# Altium footprint library CONN_TBLOCK.PcbLib: 69 footprints (part 2 of 5)
Each footprint in its own frame and in the unit in brackets; x right, y up, seen from the top. Pads: shape width x height; smd on the part's side, far side on the other; paste and mask are expansions set on the pad; w line width, h text height; cw(c..) or ccw(c..) is an arc to the next point about the centre after c.
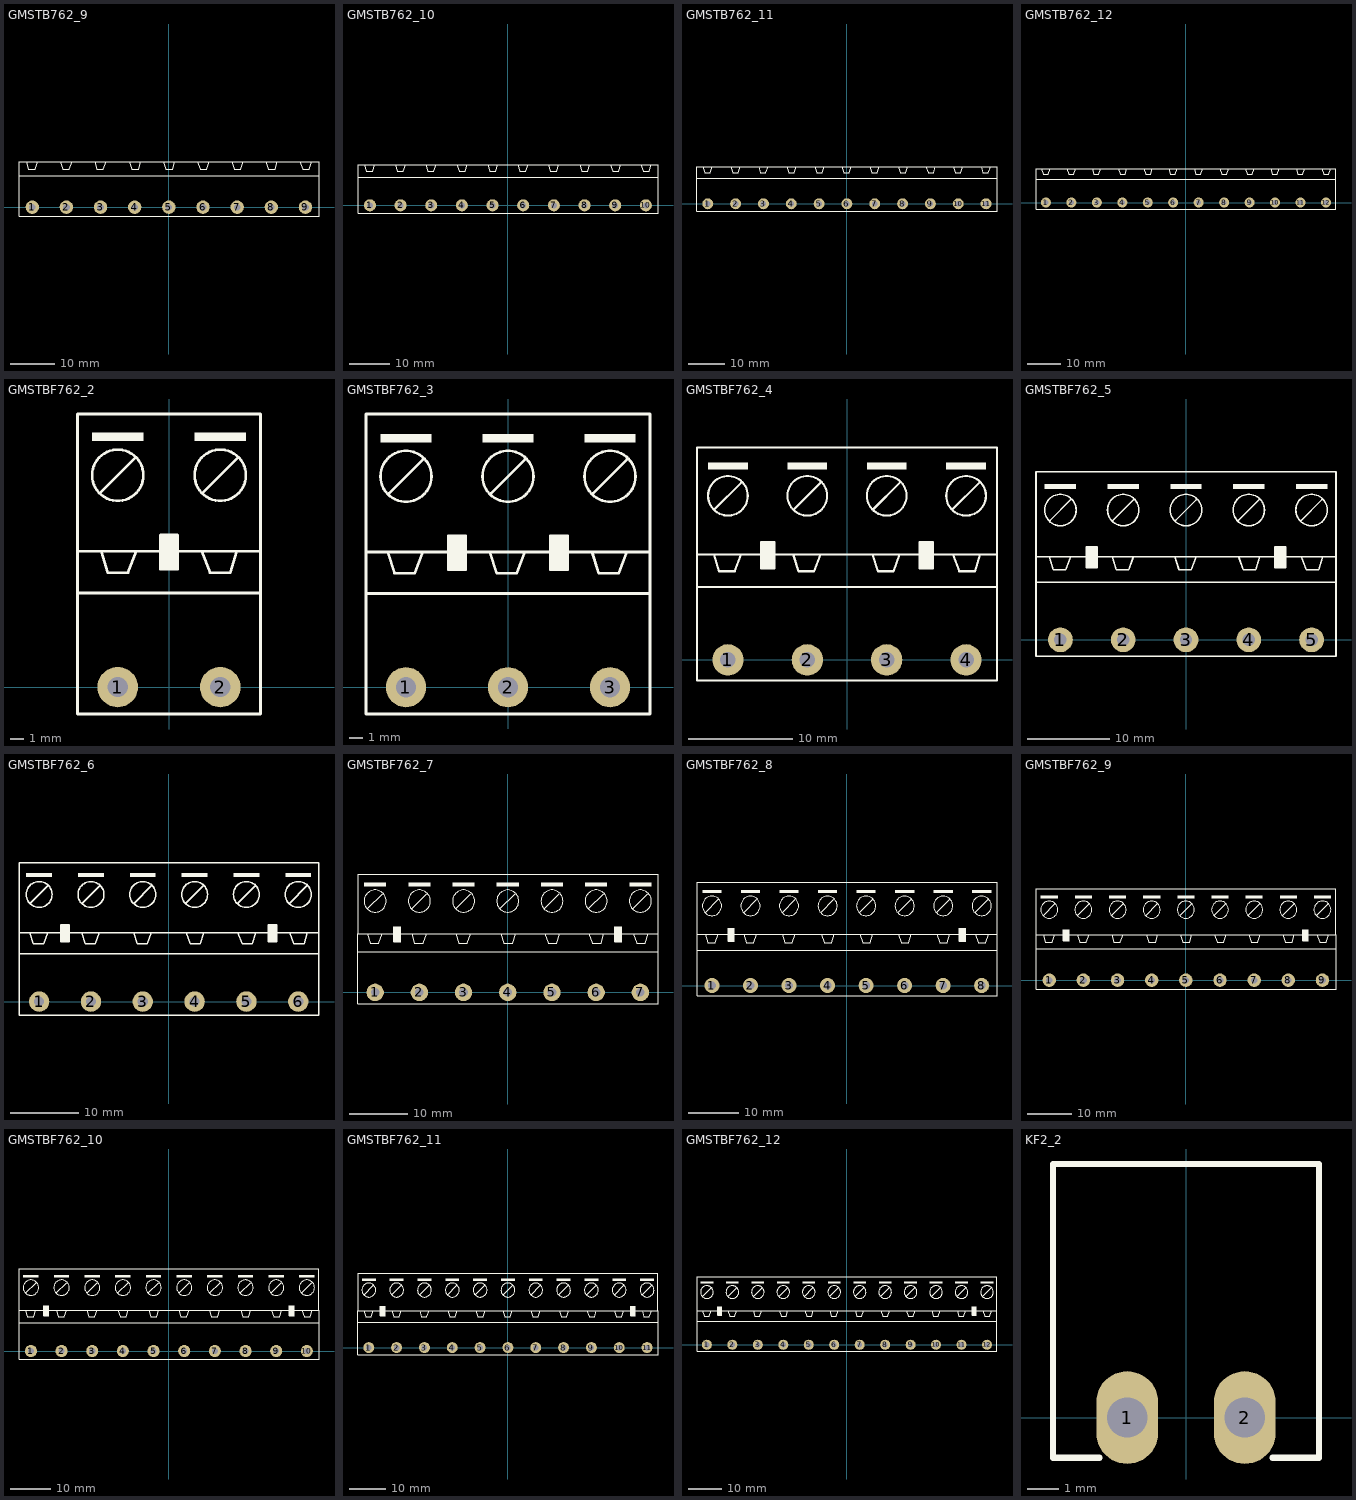
[diagram p1: the footprints below, top view; thin cyan lines are the x and y axes]

## GMSTB762_9 [mm] "PHOENIX, GMSTB 2,5/9-G-7,62, 7.62mm pitch, 9pin"
pads (9):
  round 3 hole 1.5: 1(-30.48,0) 2(-22.86,0) 3(-15.24,0) 4(-7.62,0) 5(0,0) 6(7.62,0) 7(15.24,0) 8(22.86,0) 9(30.48,0)
Top Overlay:
  lines w0.2: -33.44,7 33.5,7 ; -31.83,10.1 -31.33,8.5 -29.83,8.5 -29.23,10.1 ; -24.21,10.1 -23.71,8.5 -22.21,8.5 -21.61,10.1 ; -16.59,10.1 -16.09,8.5 -14.59,8.5 -13.99,10.1 ; -8.87,10.1 -8.27,8.5 -6.77,8.5 -6.27,10.1 ; -1.25,10.1 -0.65,8.5 0.85,8.5 1.35,10.1 ; 6.37,10.1 6.97,8.5 8.47,8.5 8.97,10.1 ; 13.99,10.1 14.59,8.5 16.09,8.5 16.59,10.1 ; 21.61,10.1 22.21,8.5 23.71,8.5 24.21,10.1 ; 29.23,10.1 29.83,8.5 31.33,8.5 31.83,10.1 ; -33.44,-2 33.5,-2 33.5,10.1 -33.44,10.1 -33.44,-2
3D body "GMSTB-2-5-9-G-7-62_3D.stp": height 9.1, standoff -3, extent -33.39,-1.9 33.39,10.102

## GMSTB762_10 [mm] "PHOENIX, GMSTB 2,5/10-G-7,62, 7.62mm pitch, 10pin"
pads (10):
  round 3 hole 1.5: 1(-34.29,0) 2(-26.67,0) 3(-19.05,0) 4(-11.43,0) 5(-3.81,0) 6(3.81,0) 7(11.43,0) 8(19.05,0) 9(26.67,0) 10(34.29,0)
Top Overlay:
  lines w0.2: -37.25,7 37.3,7 ; -35.64,10.1 -35.14,8.5 -33.64,8.5 -33.04,10.1 ; -28.02,10.1 -27.52,8.5 -26.02,8.5 -25.42,10.1 ; -20.4,10.1 -19.9,8.5 -18.4,8.5 -17.8,10.1 ; -12.68,10.1 -12.08,8.5 -10.58,8.5 -10.08,10.1 ; -5.06,10.1 -4.46,8.5 -2.96,8.5 -2.46,10.1 ; 2.46,10.1 2.96,8.5 4.46,8.5 5.06,10.1 ; 10.08,10.1 10.58,8.5 12.08,8.5 12.68,10.1 ; 17.8,10.1 18.4,8.5 19.9,8.5 20.4,10.1 ; 25.42,10.1 26.02,8.5 27.52,8.5 28.02,10.1 ; 33.04,10.1 33.64,8.5 35.14,8.5 35.64,10.1 ; -37.25,-2 37.3,-2 37.3,10.1 -37.25,10.1 -37.25,-2
3D body "GMSTB-2-5-10-G-7-62_3D.stp": height 9.1, standoff -3, extent -37.2,-1.9 37.2,10.102

## GMSTB762_11 [mm] "PHOENIX, GMSTB 2,5/11-G-7,62, 7.62mm pitch, 11pin"
pads (11):
  round 3 hole 1.5: 1(-38.1,0) 2(-30.48,0) 3(-22.86,0) 4(-15.24,0) 5(-7.62,0) 6(0,0) 7(7.62,0) 8(15.24,0) 9(22.86,0) 10(30.48,0) 11(38.1,0)
Top Overlay:
  lines w0.2: -41.06,7 41.1,7 ; -39.45,10.1 -38.95,8.5 -37.45,8.5 -36.85,10.1 ; -31.83,10.1 -31.33,8.5 -29.83,8.5 -29.23,10.1 ; -24.21,10.1 -23.71,8.5 -22.21,8.5 -21.61,10.1 ; -16.49,10.1 -15.89,8.5 -14.39,8.5 -13.89,10.1 ; -8.87,10.1 -8.27,8.5 -6.77,8.5 -6.27,10.1 ; -1.35,10.1 -0.85,8.5 0.65,8.5 1.25,10.1 ; 6.27,10.1 6.77,8.5 8.27,8.5 8.87,10.1 ; 13.99,10.1 14.59,8.5 16.09,8.5 16.59,10.1 ; 21.61,10.1 22.21,8.5 23.71,8.5 24.21,10.1 ; 29.13,10.1 29.63,8.5 31.13,8.5 31.73,10.1 ; 36.75,10.1 37.25,8.5 38.75,8.5 39.35,10.1 ; -41.06,-2 -41.06,10.1 41.1,10.1 41.1,-2 -41.06,-2
3D body "GMSTB-2-5-11-G-7-62_3D.stp": height 9.1, standoff -3, extent -41.01,-1.9 41.01,10.102

## GMSTB762_12 [mm] "PHOENIX, GMSTB 2,5/12-G-7,62, 7.62mm pitch, 12pin"
pads (12):
  round 3 hole 1.5: 1(-41.91,0) 2(-34.29,0) 3(-26.67,0) 4(-19.05,0) 5(-11.43,0) 6(-3.81,0) 7(3.81,0) 8(11.43,0) 9(19.05,0) 10(26.67,0) 11(34.29,0) 12(41.91,0)
Top Overlay:
  lines w0.2: -44.87,7 44.9,7 ; -43.26,10.1 -42.76,8.5 -41.26,8.5 -40.66,10.1 ; -35.64,10.1 -35.14,8.5 -33.64,8.5 -33.04,10.1 ; -28.02,10.1 -27.52,8.5 -26.02,8.5 -25.42,10.1 ; -20.3,10.1 -19.7,8.5 -18.2,8.5 -17.7,10.1 ; -12.68,10.1 -12.08,8.5 -10.58,8.5 -10.08,10.1 ; -5.16,10.1 -4.66,8.5 -3.16,8.5 -2.56,10.1 ; 2.46,10.1 2.96,8.5 4.46,8.5 5.06,10.1 ; 10.18,10.1 10.78,8.5 12.28,8.5 12.78,10.1 ; 17.8,10.1 18.4,8.5 19.9,8.5 20.4,10.1 ; 25.32,10.1 25.82,8.5 27.32,8.5 27.92,10.1 ; 32.94,10.1 33.44,8.5 34.94,8.5 35.54,10.1 ; 40.66,10.1 41.26,8.5 42.76,8.5 43.26,10.1 ; -44.87,-2 44.9,-2 44.9,10.1 -44.87,10.1 -44.87,-2
3D body "GMSTB-2-5-12-G-7-62_3D.stp": height 9.1, standoff -3, extent -44.82,-1.9 44.82,10.102

## GMSTBF762_2 [mm] "PHOENIX, GMSTB 2,5/2-G-7,62, 7.62mm pitch, 2pin"
pads (2):
  round 3 hole 1.5: 1(-3.81,0) 2(3.81,0)
Top Overlay:
  circle w0.2: c3.81,15.748 r1.905
  circle w0.2: c-3.81,15.748 r1.905
  region: 0.635,11.303 -0.635,11.303 -0.635,8.763 0.635,8.763
  region: 5.715,18.923 1.905,18.923 1.905,18.288 5.715,18.288
  region: -1.905,18.923 -5.715,18.923 -5.715,18.288 -1.905,18.288
  lines w0.2: -6.8,7 6.8,7 ; -5.08,14.478 -2.54,17.018 ; -5.05,10.1 -4.55,8.5 -3.05,8.5 -2.45,10.1 ; 2.45,10.1 3.05,8.5 4.55,8.5 5.05,10.1 ; 2.54,14.478 5.08,17.018 ; -6.8,10.1 -6.8,20.3 6.8,20.3 6.8,10.1 ; -6.8,10.1 -6.8,-2 6.8,-2 6.8,10.1 ; -6.8,10.1 6.8,10.1 ; -0.635,8.763 -0.635,11.303 0.635,11.303 0.635,8.763 -0.635,8.763
3D body "GMSTB-2-5-2-G-7-62_3D.stp": height 9.1, standoff -3, extent -6.72,-1.9 6.72,10.102
3D body "GMSTB-2-5-2-ST-7-62_3D.stp": height 15.5, standoff 0.5, extent -6.62,2 6.62,20.2

## GMSTBF762_3 [mm] "PHOENIX, GMSTB 2,5/3-G-7,62, 7.62mm pitch, 3pin"
pads (3):
  round 3 hole 1.5: 1(-7.62,0) 2(0,0) 3(7.62,0)
Top Overlay:
  circle w0.2: c-7.62,15.748 r1.905
  circle w0.2: c0,15.748 r1.905
  circle w0.2: c7.62,15.748 r1.905
  rectangle: 3.175,8.763 4.445,11.303
  region: -3.175,11.303 -4.445,11.303 -4.445,8.763 -3.175,8.763
  region: -5.715,18.923 -9.525,18.923 -9.525,18.288 -5.715,18.288
  region: 1.905,18.923 -1.905,18.923 -1.905,18.288 1.905,18.288
  region: 9.525,18.923 5.715,18.923 5.715,18.288 9.525,18.288
  lines w0.2: -10.6,7 10.6,7 ; -8.97,10.1 -8.47,8.5 -6.97,8.5 -6.37,10.1 ; -8.89,14.478 -6.35,17.018 ; -1.35,10.1 -0.85,8.5 0.65,8.5 1.25,10.1 ; -1.27,14.478 1.27,17.018 ; 6.27,10.1 6.77,8.5 8.27,8.5 8.87,10.1 ; 6.35,14.478 8.89,17.018 ; -10.6,10.1 -10.6,20.4 10.6,20.4 10.6,10.1 ; -10.6,10.1 -10.6,-2 10.6,-2 10.6,10.1 ; -10.6,10.1 10.6,10.1 ; -4.445,8.763 -4.445,11.303 -3.175,11.303 -3.175,8.763 -4.445,8.763 ; 3.175,8.763 4.445,8.763 4.445,11.303 3.175,11.303 3.175,8.763
3D body "GMSTB-2-5-3-ST-7-62_3D.stp": height 15.5, standoff 0.5, extent -10.43,2 10.43,20.2
3D body "GMSTB-2-5-3-G-7-62_3D.stp": height 9.1, standoff -3, extent -10.53,-1.9 10.53,10.102

## GMSTBF762_4 [mm] "PHOENIX, GMSTB 2,5/4-G-7,62, 7.62mm pitch, 4pin"
pads (4):
  round 3 hole 1.5: 1(-11.43,0) 2(-3.81,0) 3(3.81,0) 4(11.43,0)
Top Overlay:
  circle w0.2: c11.43,15.748 r1.905
  circle w0.2: c3.81,15.748 r1.905
  circle w0.2: c-3.81,15.748 r1.905
  circle w0.2: c-11.43,15.748 r1.905
  region: 13.335,18.923 9.525,18.923 9.525,18.288 13.335,18.288
  region: 5.715,18.923 1.905,18.923 1.905,18.288 5.715,18.288
  region: -1.905,18.923 -5.715,18.923 -5.715,18.288 -1.905,18.288
  region: -9.525,18.923 -13.335,18.923 -13.335,18.288 -9.525,18.288
  region: -6.985,11.303 -8.255,11.303 -8.255,8.763 -6.985,8.763
  rectangle: 6.985,8.763 8.255,11.303
  lines w0.2: -14.4,7 14.4,7 ; -12.78,10.1 -12.28,8.5 -10.78,8.5 -10.18,10.1 ; -12.7,14.478 -10.16,17.018 ; -5.16,10.1 -4.66,8.5 -3.16,8.5 -2.56,10.1 ; -5.08,14.478 -2.54,17.018 ; 2.46,10.1 2.96,8.5 4.46,8.5 5.06,10.1 ; 2.54,14.478 5.08,17.018 ; 10.16,14.478 12.7,17.018 ; 10.18,10.1 10.78,8.5 12.28,8.5 12.78,10.1 ; -14.4,10.1 14.4,10.1 ; -14.4,10.1 -14.4,-2 14.4,-2 14.4,10.1 ; -14.4,10.1 -14.4,20.4 14.4,20.4 14.4,10.1 ; -8.255,8.763 -6.985,8.763 -6.985,11.303 -8.255,11.303 -8.255,8.763 ; 6.985,8.763 6.985,11.303 8.255,11.303 8.255,8.763 6.985,8.763
3D body "GMSTB-2-5-4-ST-7-62_3D.stp": height 15.5, standoff 0.5, extent -14.24,2 14.24,20.2
3D body "GMSTB-2-5-4-G-7-62_3D.stp": height 9.1, standoff -3, extent -14.34,-1.9 14.34,10.102

## GMSTBF762_5 [mm] "PHOENIX, GMSTB 2,5/5-G-7,62, 7.62mm pitch, 5pin"
pads (5):
  round 3 hole 1.5: 1(-15.24,0) 2(-7.62,0) 3(0,0) 4(7.62,0) 5(15.24,0)
Top Overlay:
  circle w0.2: c15.24,15.748 r1.905
  circle w0.2: c7.62,15.748 r1.905
  circle w0.2: c0,15.748 r1.905
  circle w0.2: c-7.62,15.748 r1.905
  circle w0.2: c-15.24,15.748 r1.905
  region: -10.795,11.303 -12.065,11.303 -12.065,8.763 -10.795,8.763
  rectangle: 10.795,8.763 12.065,11.303
  region: 17.145,18.923 13.335,18.923 13.335,18.288 17.145,18.288
  region: 9.525,18.923 5.715,18.923 5.715,18.288 9.525,18.288
  region: 1.905,18.923 -1.905,18.923 -1.905,18.288 1.905,18.288
  region: -5.715,18.923 -9.525,18.923 -9.525,18.288 -5.715,18.288
  region: -13.335,18.923 -17.145,18.923 -17.145,18.288 -13.335,18.288
  lines w0.2: -18.2,7 18.2,7 ; -16.59,10.1 -16.09,8.5 -14.59,8.5 -13.99,10.1 ; -16.51,14.478 -13.97,17.018 ; -8.97,10.1 -8.47,8.5 -6.97,8.5 -6.37,10.1 ; -8.89,14.478 -6.35,17.018 ; -1.35,10.1 -0.85,8.5 0.65,8.5 1.25,10.1 ; -1.27,14.478 1.27,17.018 ; 6.35,14.478 8.89,17.018 ; 6.37,10.1 6.97,8.5 8.47,8.5 8.97,10.1 ; 13.97,14.478 16.51,17.018 ; 13.99,10.1 14.59,8.5 16.09,8.5 16.59,10.1 ; -18.2,10.1 18.2,10.1 ; -18.2,10.1 -18.2,-2 18.2,-2 18.2,10.1 ; -18.2,10.1 -18.2,20.4 18.2,20.4 18.2,10.1 ; -12.065,8.763 -12.065,11.303 -10.795,11.303 -10.795,8.763 -12.065,8.763 ; 10.795,8.763 12.065,8.763 12.065,11.303 10.795,11.303 10.795,8.763
3D body "GMSTB-2-5-5-G-7-62_3D.stp": height 9.1, standoff -3, extent -18.15,-1.9 18.15,10.102
3D body "GMSTB-2-5-5-ST-7-62_3D.stp": height 15.5, standoff 0.5, extent -18.05,2 18.05,20.2

## GMSTBF762_6 [mm] "PHOENIX, GMSTB 2,5/6-G-7,62, 7.62mm pitch, 6pin"
pads (6):
  round 3 hole 1.5: 1(-19.05,0) 2(-11.43,0) 3(-3.81,0) 4(3.81,0) 5(11.43,0) 6(19.05,0)
Top Overlay:
  circle w0.2: c19.05,15.748 r1.905
  circle w0.2: c11.43,15.748 r1.905
  circle w0.2: c3.81,15.748 r1.905
  circle w0.2: c-3.81,15.748 r1.905
  circle w0.2: c-11.43,15.748 r1.905
  circle w0.2: c-19.05,15.748 r1.905
  rectangle: 14.605,8.763 15.875,11.303
  region: -14.605,11.303 -15.875,11.303 -15.875,8.763 -14.605,8.763
  region: 20.955,18.923 17.145,18.923 17.145,18.288 20.955,18.288
  region: 13.335,18.923 9.525,18.923 9.525,18.288 13.335,18.288
  region: 5.715,18.923 1.905,18.923 1.905,18.288 5.715,18.288
  region: -1.905,18.923 -5.715,18.923 -5.715,18.288 -1.905,18.288
  region: -9.525,18.923 -13.335,18.923 -13.335,18.288 -9.525,18.288
  region: -17.145,18.923 -20.955,18.923 -20.955,18.288 -17.145,18.288
  lines w0.2: -22.01,7 22.1,7 ; -22,10.1 -22,20.4 22.1,20.4 22.1,10.1 ; -20.4,10.1 -19.9,8.5 -18.4,8.5 -17.8,10.1 ; -20.32,14.478 -17.78,17.018 ; -12.78,10.1 -12.28,8.5 -10.78,8.5 -10.18,10.1 ; -12.7,14.478 -10.16,17.018 ; -5.16,10.1 -4.66,8.5 -3.16,8.5 -2.56,10.1 ; -5.08,14.478 -2.54,17.018 ; 2.54,14.478 5.08,17.018 ; 2.56,10.1 3.16,8.5 4.66,8.5 5.16,10.1 ; 10.16,14.478 12.7,17.018 ; 10.18,10.1 10.78,8.5 12.28,8.5 12.78,10.1 ; 17.78,14.478 20.32,17.018 ; 17.8,10.1 18.4,8.5 19.9,8.5 20.4,10.1 ; 22.1,10.1 22.1,-2 -22.01,-2 -22.01,10.1 22.1,10.1 ; -15.875,8.763 -15.875,11.303 -14.605,11.303 -14.605,8.763 -15.875,8.763 ; 14.605,8.763 15.875,8.763 15.875,11.303 14.605,11.303 14.605,8.763
3D body "GMSTB-2-5-6-G-7-62_3D.stp": height 9.1, standoff -3, extent -21.96,-1.9 21.96,10.102
3D body "GMSTB-2-5-6-ST-7-62_3D.stp": height 15.5, standoff 0.5, extent -21.86,2 21.86,20.2

## GMSTBF762_7 [mm] "PHOENIX, GMSTB 2,5/7-G-7,62, 7.62mm pitch, 7pin"
pads (7):
  round 3 hole 1.5: 1(-22.86,0) 2(-15.24,0) 3(-7.62,0) 4(0,0) 5(7.62,0) 6(15.24,0) 7(22.86,0)
Top Overlay:
  circle w0.2: c22.86,15.748 r1.905
  circle w0.2: c15.24,15.748 r1.905
  circle w0.2: c7.62,15.748 r1.905
  circle w0.2: c0,15.748 r1.905
  circle w0.2: c-7.62,15.748 r1.905
  circle w0.2: c-15.24,15.748 r1.905
  circle w0.2: c-22.86,15.748 r1.905
  region: -18.415,11.303 -19.685,11.303 -19.685,8.763 -18.415,8.763
  rectangle: 18.415,8.763 19.685,11.303
  region: 24.765,18.923 20.955,18.923 20.955,18.288 24.765,18.288
  region: 17.145,18.923 13.335,18.923 13.335,18.288 17.145,18.288
  region: 9.525,18.923 5.715,18.923 5.715,18.288 9.525,18.288
  region: 1.905,18.923 -1.905,18.923 -1.905,18.288 1.905,18.288
  region: -5.715,18.923 -9.525,18.923 -9.525,18.288 -5.715,18.288
  region: -13.335,18.923 -17.145,18.923 -17.145,18.288 -13.335,18.288
  region: -20.955,18.923 -24.765,18.923 -24.765,18.288 -20.955,18.288
  lines w0.2: -25.82,7 25.9,7 ; -25.8,10.1 -25.8,20.4 25.9,20.4 25.9,10.1 ; -24.21,10.1 -23.71,8.5 -22.21,8.5 -21.61,10.1 ; -24.13,14.478 -21.59,17.018 ; -16.59,10.1 -16.09,8.5 -14.59,8.5 -13.99,10.1 ; -16.51,14.478 -13.97,17.018 ; -8.97,10.1 -8.47,8.5 -6.97,8.5 -6.37,10.1 ; -8.89,14.478 -6.35,17.018 ; -1.27,14.478 1.27,17.018 ; -1.25,10.1 -0.65,8.5 0.85,8.5 1.35,10.1 ; 6.35,14.478 8.89,17.018 ; 6.37,10.1 6.97,8.5 8.47,8.5 8.97,10.1 ; 13.97,14.478 16.51,17.018 ; 13.99,10.1 14.59,8.5 16.09,8.5 16.59,10.1 ; 21.59,14.478 24.13,17.018 ; 21.61,10.1 22.21,8.5 23.71,8.5 24.21,10.1 ; 25.9,10.1 25.9,-2 -25.82,-2 -25.82,10.1 25.9,10.1 ; -19.685,8.763 -19.685,11.303 -18.415,11.303 -18.415,8.763 -19.685,8.763 ; 18.415,8.763 19.685,8.763 19.685,11.303 18.415,11.303 18.415,8.763
3D body "GMSTB-2-5-7-G-7-62_3D.stp": height 9.1, standoff -3, extent -25.77,-1.9 25.77,10.102
3D body "GMSTB-2-5-7-ST-7-62_3D.stp": height 15.5, standoff 0.5, extent -25.67,2 25.67,20.2

## GMSTBF762_8 [mm] "PHOENIX, GMSTB 2,5/8-G-7,62, 7.62mm pitch, 8pin"
pads (8):
  round 3 hole 1.5: 1(-26.67,0) 2(-19.05,0) 3(-11.43,0) 4(-3.81,0) 5(3.81,0) 6(11.43,0) 7(19.05,0) 8(26.67,0)
Top Overlay:
  circle w0.2: c26.67,15.748 r1.905
  circle w0.2: c19.05,15.748 r1.905
  circle w0.2: c11.43,15.748 r1.905
  circle w0.2: c3.81,15.748 r1.905
  circle w0.2: c-3.81,15.748 r1.905
  circle w0.2: c-11.43,15.748 r1.905
  circle w0.2: c-19.05,15.748 r1.905
  circle w0.2: c-26.67,15.748 r1.905
  rectangle: 22.225,8.763 23.495,11.303
  region: -22.225,11.303 -23.495,11.303 -23.495,8.763 -22.225,8.763
  region: 28.575,18.923 24.765,18.923 24.765,18.288 28.575,18.288
  region: 20.955,18.923 17.145,18.923 17.145,18.288 20.955,18.288
  region: 13.335,18.923 9.525,18.923 9.525,18.288 13.335,18.288
  region: 5.715,18.923 1.905,18.923 1.905,18.288 5.715,18.288
  region: -1.905,18.923 -5.715,18.923 -5.715,18.288 -1.905,18.288
  region: -9.525,18.923 -13.335,18.923 -13.335,18.288 -9.525,18.288
  region: -17.145,18.923 -20.955,18.923 -20.955,18.288 -17.145,18.288
  region: -24.765,18.923 -28.575,18.923 -28.575,18.288 -24.765,18.288
  lines w0.2: -29.63,7 29.7,7 ; -29.6,10.1 -29.6,20.4 29.7,20.4 29.7,10.1 ; -28.02,10.1 -27.52,8.5 -26.02,8.5 -25.42,10.1 ; -27.94,14.478 -25.4,17.018 ; -20.4,10.1 -19.9,8.5 -18.4,8.5 -17.8,10.1 ; -20.32,14.478 -17.78,17.018 ; -12.78,10.1 -12.28,8.5 -10.78,8.5 -10.18,10.1 ; -12.7,14.478 -10.16,17.018 ; -5.08,14.478 -2.54,17.018 ; -5.06,10.1 -4.46,8.5 -2.96,8.5 -2.46,10.1 ; 2.54,14.478 5.08,17.018 ; 2.56,10.1 3.16,8.5 4.66,8.5 5.16,10.1 ; 10.16,14.478 12.7,17.018 ; 10.18,10.1 10.78,8.5 12.28,8.5 12.78,10.1 ; 17.78,14.478 20.32,17.018 ; 17.8,10.1 18.4,8.5 19.9,8.5 20.4,10.1 ; 25.4,14.478 27.94,17.018 ; 25.42,10.1 26.02,8.5 27.52,8.5 28.02,10.1 ; 29.7,10.1 -29.63,10.1 -29.63,-2 29.7,-2 29.7,10.1 ; -23.495,8.763 -23.495,11.303 -22.225,11.303 -22.225,8.763 -23.495,8.763 ; 22.225,8.763 23.495,8.763 23.495,11.303 22.225,11.303 22.225,8.763
3D body "GMSTB-2-5-8-G-7-62_3D.stp": height 9.1, standoff -3, extent -29.58,-1.9 29.58,10.102
3D body "GMSTB-2-5-8-ST-7-62_3D.stp": height 15.5, standoff 0.5, extent -29.48,2 29.48,20.2

## GMSTBF762_9 [mm] "PHOENIX, GMSTB 2,5/9-G-7,62, 7.62mm pitch, 9pin"
pads (9):
  round 3 hole 1.5: 1(-30.48,0) 2(-22.86,0) 3(-15.24,0) 4(-7.62,0) 5(0,0) 6(7.62,0) 7(15.24,0) 8(22.86,0) 9(30.48,0)
Top Overlay:
  circle w0.2: c30.48,15.748 r1.905
  circle w0.2: c22.86,15.748 r1.905
  circle w0.2: c15.24,15.748 r1.905
  circle w0.2: c7.62,15.748 r1.905
  circle w0.2: c-30.48,15.748 r1.905
  circle w0.2: c-22.86,15.748 r1.905
  circle w0.2: c-15.24,15.748 r1.905
  circle w0.2: c-7.62,15.748 r1.905
  circle w0.2: c0,15.748 r1.905
  region: -26.035,11.303 -27.305,11.303 -27.305,8.763 -26.035,8.763
  rectangle: 26.035,8.763 27.305,11.303
  region: 32.385,18.923 28.575,18.923 28.575,18.288 32.385,18.288
  region: 24.765,18.923 20.955,18.923 20.955,18.288 24.765,18.288
  region: 17.145,18.923 13.335,18.923 13.335,18.288 17.145,18.288
  region: 9.525,18.923 5.715,18.923 5.715,18.288 9.525,18.288
  region: -28.575,18.923 -32.385,18.923 -32.385,18.288 -28.575,18.288
  region: -20.955,18.923 -24.765,18.923 -24.765,18.288 -20.955,18.288
  region: -13.335,18.923 -17.145,18.923 -17.145,18.288 -13.335,18.288
  region: -5.715,18.923 -9.525,18.923 -9.525,18.288 -5.715,18.288
  region: 1.905,18.923 -1.905,18.923 -1.905,18.288 1.905,18.288
  lines w0.2: -33.44,7 33.5,7 ; -33.4,10.1 -33.4,20.4 33.4,20.4 33.4,10.1 ; -31.83,10.1 -31.33,8.5 -29.83,8.5 -29.23,10.1 ; -31.75,14.478 -29.21,17.018 ; -24.21,10.1 -23.71,8.5 -22.21,8.5 -21.61,10.1 ; -24.13,14.478 -21.59,17.018 ; -16.59,10.1 -16.09,8.5 -14.59,8.5 -13.99,10.1 ; -16.51,14.478 -13.97,17.018 ; -8.89,14.478 -6.35,17.018 ; -8.87,10.1 -8.27,8.5 -6.77,8.5 -6.27,10.1 ; -1.27,14.478 1.27,17.018 ; -1.25,10.1 -0.65,8.5 0.85,8.5 1.35,10.1 ; 6.35,14.478 8.89,17.018 ; 6.37,10.1 6.97,8.5 8.47,8.5 8.97,10.1 ; 13.97,14.478 16.51,17.018 ; 13.99,10.1 14.59,8.5 16.09,8.5 16.59,10.1 ; 21.59,14.478 24.13,17.018 ; 21.61,10.1 22.21,8.5 23.71,8.5 24.21,10.1 ; 29.21,14.478 31.75,17.018 ; 29.23,10.1 29.83,8.5 31.33,8.5 31.83,10.1 ; -33.44,-2 33.5,-2 33.5,10.1 -33.44,10.1 -33.44,-2 ; -27.305,8.763 -27.305,11.303 -26.035,11.303 -26.035,8.763 -27.305,8.763 ; 26.035,8.763 27.305,8.763 27.305,11.303 26.035,11.303 26.035,8.763
3D body "GMSTB-2-5-9-ST-7-62_3D.stp": height 15.5, standoff 0.5, extent -33.29,2 33.29,20.2
3D body "GMSTB-2-5-9-G-7-62_3D.stp": height 9.1, standoff -3, extent -33.39,-1.9 33.39,10.102

## GMSTBF762_10 [mm] "PHOENIX, GMSTB 2,5/10-G-7,62, 7.62mm pitch, 10pin"
pads (10):
  round 3 hole 1.5: 1(-34.29,0) 2(-26.67,0) 3(-19.05,0) 4(-11.43,0) 5(-3.81,0) 6(3.81,0) 7(11.43,0) 8(19.05,0) 9(26.67,0) 10(34.29,0)
Top Overlay:
  circle w0.2: c34.29,15.748 r1.905
  circle w0.2: c26.67,15.748 r1.905
  circle w0.2: c19.05,15.748 r1.905
  circle w0.2: c11.43,15.748 r1.905
  circle w0.2: c3.81,15.748 r1.905
  circle w0.2: c-3.81,15.748 r1.905
  circle w0.2: c-11.43,15.748 r1.905
  circle w0.2: c-19.05,15.748 r1.905
  circle w0.2: c-26.67,15.748 r1.905
  circle w0.2: c-34.29,15.748 r1.905
  rectangle: 29.845,8.763 31.115,11.303
  region: -29.845,11.303 -31.115,11.303 -31.115,8.763 -29.845,8.763
  region: 36.195,18.923 32.385,18.923 32.385,18.288 36.195,18.288
  region: 28.575,18.923 24.765,18.923 24.765,18.288 28.575,18.288
  region: 20.955,18.923 17.145,18.923 17.145,18.288 20.955,18.288
  region: 13.335,18.923 9.525,18.923 9.525,18.288 13.335,18.288
  region: 5.715,18.923 1.905,18.923 1.905,18.288 5.715,18.288
  region: -1.905,18.923 -5.715,18.923 -5.715,18.288 -1.905,18.288
  region: -9.525,18.923 -13.335,18.923 -13.335,18.288 -9.525,18.288
  region: -17.145,18.923 -20.955,18.923 -20.955,18.288 -17.145,18.288
  region: -24.765,18.923 -28.575,18.923 -28.575,18.288 -24.765,18.288
  region: -32.385,18.923 -36.195,18.923 -36.195,18.288 -32.385,18.288
  lines w0.2: -37.25,7 37.3,7 ; -37.2,10.1 -37.2,20.4 37.2,20.4 37.2,10.1 ; -35.64,10.1 -35.14,8.5 -33.64,8.5 -33.04,10.1 ; -35.56,14.478 -33.02,17.018 ; -28.02,10.1 -27.52,8.5 -26.02,8.5 -25.42,10.1 ; -27.94,14.478 -25.4,17.018 ; -20.4,10.1 -19.9,8.5 -18.4,8.5 -17.8,10.1 ; -20.32,14.478 -17.78,17.018 ; -12.7,14.478 -10.16,17.018 ; -12.68,10.1 -12.08,8.5 -10.58,8.5 -10.08,10.1 ; -5.08,14.478 -2.54,17.018 ; -5.06,10.1 -4.46,8.5 -2.96,8.5 -2.46,10.1 ; 2.46,10.1 2.96,8.5 4.46,8.5 5.06,10.1 ; 2.54,14.478 5.08,17.018 ; 10.08,10.1 10.58,8.5 12.08,8.5 12.68,10.1 ; 10.16,14.478 12.7,17.018 ; 17.78,14.478 20.32,17.018 ; 17.8,10.1 18.4,8.5 19.9,8.5 20.4,10.1 ; 25.4,14.478 27.94,17.018 ; 25.42,10.1 26.02,8.5 27.52,8.5 28.02,10.1 ; 33.02,14.478 35.56,17.018 ; 33.04,10.1 33.64,8.5 35.14,8.5 35.64,10.1 ; -37.25,-2 37.3,-2 37.3,10.1 -37.25,10.1 -37.25,-2 ; -31.115,8.763 -31.115,11.303 -29.845,11.303 -29.845,8.763 -31.115,8.763 ; 29.845,8.763 31.115,8.763 31.115,11.303 29.845,11.303 29.845,8.763
3D body "GMSTB-2-5-10-G-7-62_3D.stp": height 9.1, standoff -3, extent -37.2,-1.9 37.2,10.102
3D body "GMSTB-2-5-10-ST-7-62_3D.stp": height 15.5, standoff 0.5, extent -37.1,2 37.1,20.2

## GMSTBF762_11 [mm] "PHOENIX, GMSTB 2,5/11-G-7,62, 7.62mm pitch, 11pin"
pads (11):
  round 3 hole 1.5: 1(-38.1,0) 2(-30.48,0) 3(-22.86,0) 4(-15.24,0) 5(-7.62,0) 6(0,0) 7(7.62,0) 8(15.24,0) 9(22.86,0) 10(30.48,0) 11(38.1,0)
Top Overlay:
  circle w0.2: c-38.1,15.748 r1.905
  circle w0.2: c-30.48,15.748 r1.905
  circle w0.2: c-22.86,15.748 r1.905
  circle w0.2: c-15.24,15.748 r1.905
  circle w0.2: c-7.62,15.748 r1.905
  circle w0.2: c0,15.748 r1.905
  circle w0.2: c7.62,15.748 r1.905
  circle w0.2: c15.24,15.748 r1.905
  circle w0.2: c22.86,15.748 r1.905
  circle w0.2: c30.48,15.748 r1.905
  circle w0.2: c38.1,15.748 r1.905
  region: -36.195,18.923 -40.005,18.923 -40.005,18.288 -36.195,18.288
  region: -28.575,18.923 -32.385,18.923 -32.385,18.288 -28.575,18.288
  region: -20.955,18.923 -24.765,18.923 -24.765,18.288 -20.955,18.288
  region: -13.335,18.923 -17.145,18.923 -17.145,18.288 -13.335,18.288
  region: -5.715,18.923 -9.525,18.923 -9.525,18.288 -5.715,18.288
  region: 1.905,18.923 -1.905,18.923 -1.905,18.288 1.905,18.288
  region: 9.525,18.923 5.715,18.923 5.715,18.288 9.525,18.288
  region: 17.145,18.923 13.335,18.923 13.335,18.288 17.145,18.288
  region: 24.765,18.923 20.955,18.923 20.955,18.288 24.765,18.288
  region: 32.385,18.923 28.575,18.923 28.575,18.288 32.385,18.288
  region: 40.005,18.923 36.195,18.923 36.195,18.288 40.005,18.288
  rectangle: 33.655,8.763 34.925,11.303
  region: -33.655,11.303 -34.925,11.303 -34.925,8.763 -33.655,8.763
  lines w0.2: -41.06,7 41.1,7 ; -41,10.1 -41,20.4 41,20.4 41,10.1 ; -39.45,10.1 -38.95,8.5 -37.45,8.5 -36.85,10.1 ; -39.37,14.478 -36.83,17.018 ; -31.83,10.1 -31.33,8.5 -29.83,8.5 -29.23,10.1 ; -31.75,14.478 -29.21,17.018 ; -24.21,10.1 -23.71,8.5 -22.21,8.5 -21.61,10.1 ; -24.13,14.478 -21.59,17.018 ; -16.51,14.478 -13.97,17.018 ; -16.49,10.1 -15.89,8.5 -14.39,8.5 -13.89,10.1 ; -8.89,14.478 -6.35,17.018 ; -8.87,10.1 -8.27,8.5 -6.77,8.5 -6.27,10.1 ; -1.35,10.1 -0.85,8.5 0.65,8.5 1.25,10.1 ; -1.27,14.478 1.27,17.018 ; 6.27,10.1 6.77,8.5 8.27,8.5 8.87,10.1 ; 6.35,14.478 8.89,17.018 ; 13.97,14.478 16.51,17.018 ; 13.99,10.1 14.59,8.5 16.09,8.5 16.59,10.1 ; 21.59,14.478 24.13,17.018 ; 21.61,10.1 22.21,8.5 23.71,8.5 24.21,10.1 ; 29.13,10.1 29.63,8.5 31.13,8.5 31.73,10.1 ; 29.21,14.478 31.75,17.018 ; 36.75,10.1 37.25,8.5 38.75,8.5 39.35,10.1 ; 36.83,14.478 39.37,17.018 ; -41.06,-2 41.1,-2 41.1,10.1 -41.06,10.1 -41.06,-2 ; -34.925,8.763 -33.655,8.763 -33.655,11.303 -34.925,11.303 -34.925,8.763 ; 33.655,8.763 33.655,11.303 34.925,11.303 34.925,8.763 33.655,8.763
3D body "GMSTB-2-5-11-G-7-62_3D.stp": height 9.1, standoff -3, extent -41.01,-1.9 41.01,10.102
3D body "GMSTB-2-5-11-ST-7-62_3D.stp": height 15.5, standoff 0.5, extent -40.91,2 40.91,20.2

## GMSTBF762_12 [mm] "PHOENIX, GMSTB 2,5/12-G-7,62, 7.62mm pitch, 12pin"
pads (12):
  round 3 hole 1.5: 1(-41.91,0) 2(-34.29,0) 3(-26.67,0) 4(-19.05,0) 5(-11.43,0) 6(-3.81,0) 7(3.81,0) 8(11.43,0) 9(19.05,0) 10(26.67,0) 11(34.29,0) 12(41.91,0)
Top Overlay:
  circle w0.2: c41.91,15.748 r1.905
  circle w0.2: c34.29,15.748 r1.905
  circle w0.2: c26.67,15.748 r1.905
  circle w0.2: c19.05,15.748 r1.905
  circle w0.2: c11.43,15.748 r1.905
  circle w0.2: c3.81,15.748 r1.905
  circle w0.2: c-3.81,15.748 r1.905
  circle w0.2: c-11.43,15.748 r1.905
  circle w0.2: c-19.05,15.748 r1.905
  circle w0.2: c-26.67,15.748 r1.905
  circle w0.2: c-34.29,15.748 r1.905
  circle w0.2: c-41.91,15.748 r1.905
  rectangle: 37.465,8.763 38.735,11.303
  region: -37.465,11.303 -38.735,11.303 -38.735,8.763 -37.465,8.763
  region: 43.815,18.923 40.005,18.923 40.005,18.288 43.815,18.288
  region: 36.195,18.923 32.385,18.923 32.385,18.288 36.195,18.288
  region: 28.575,18.923 24.765,18.923 24.765,18.288 28.575,18.288
  region: 20.955,18.923 17.145,18.923 17.145,18.288 20.955,18.288
  region: 13.335,18.923 9.525,18.923 9.525,18.288 13.335,18.288
  region: 5.715,18.923 1.905,18.923 1.905,18.288 5.715,18.288
  region: -1.905,18.923 -5.715,18.923 -5.715,18.288 -1.905,18.288
  region: -9.525,18.923 -13.335,18.923 -13.335,18.288 -9.525,18.288
  region: -17.145,18.923 -20.955,18.923 -20.955,18.288 -17.145,18.288
  region: -24.765,18.923 -28.575,18.923 -28.575,18.288 -24.765,18.288
  region: -32.385,18.923 -36.195,18.923 -36.195,18.288 -32.385,18.288
  region: -40.005,18.923 -43.815,18.923 -43.815,18.288 -40.005,18.288
  lines w0.2: -44.87,7 44.9,7 ; -43.26,10.1 -42.76,8.5 -41.26,8.5 -40.66,10.1 ; -43.18,14.478 -40.64,17.018 ; -35.64,10.1 -35.14,8.5 -33.64,8.5 -33.04,10.1 ; -35.56,14.478 -33.02,17.018 ; -28.02,10.1 -27.52,8.5 -26.02,8.5 -25.42,10.1 ; -27.94,14.478 -25.4,17.018 ; -20.32,14.478 -17.78,17.018 ; -20.3,10.1 -19.7,8.5 -18.2,8.5 -17.7,10.1 ; -12.7,14.478 -10.16,17.018 ; -12.68,10.1 -12.08,8.5 -10.58,8.5 -10.08,10.1 ; -5.16,10.1 -4.66,8.5 -3.16,8.5 -2.56,10.1 ; -5.08,14.478 -2.54,17.018 ; 2.46,10.1 2.96,8.5 4.46,8.5 5.06,10.1 ; 2.54,14.478 5.08,17.018 ; 10.16,14.478 12.7,17.018 ; 10.18,10.1 10.78,8.5 12.28,8.5 12.78,10.1 ; 17.78,14.478 20.32,17.018 ; 17.8,10.1 18.4,8.5 19.9,8.5 20.4,10.1 ; 25.32,10.1 25.82,8.5 27.32,8.5 27.92,10.1 ; 25.4,14.478 27.94,17.018 ; 32.94,10.1 33.44,8.5 34.94,8.5 35.54,10.1 ; 33.02,14.478 35.56,17.018 ; 40.64,14.478 43.18,17.018 ; 40.66,10.1 41.26,8.5 42.76,8.5 43.26,10.1 ; -44.87,10.1 -44.87,20.4 44.9,20.4 44.9,10.1 ; -44.87,10.1 -44.87,-2 44.9,-2 44.9,10.1 ; -44.87,10.1 44.9,10.1 ; -38.735,8.763 -38.735,11.303 -37.465,11.303 -37.465,8.763 -38.735,8.763 ; 37.465,8.763 38.735,8.763 38.735,11.303 37.465,11.303 37.465,8.763
3D body "GMSTB-2-5-12-G-7-62_3D.stp": height 9.1, standoff -3, extent -44.82,-1.9 44.82,10.102
3D body "GMSTB-2-5-12-ST-7-62_3D.stp": height 15.5, standoff 0.5, extent -44.72,2 44.72,20.2

## KF2_2 [mm] "KF2EDGR-Y-3.50/3.81MM, 3.81mm pitch, 2pin"
pads (2):
  oval 2x3 hole 1.3: 1(-1.9,0) 2(1.9,0)
Top Overlay:
  lines w0.2: -2.8,-1.3 -4.3,-1.3 -4.3,8.2 4.3,8.2 4.3,-1.3 2.8,-1.3
3D body: height 7, standoff 0, extent -4.2,-1.2 4.2,8.1